# Altium footprint library JL_PCB.PCBLIB: 1129 footprints (part 16 of 72)
Each footprint in its own frame and in the unit in brackets; x right, y up, seen from the top. Pads: shape width x height; smd on the part's side, far side on the other; paste and mask are expansions set on the pad; w line width, h text height; cw(c..) or ccw(c..) is an arc to the next point about the centre after c.
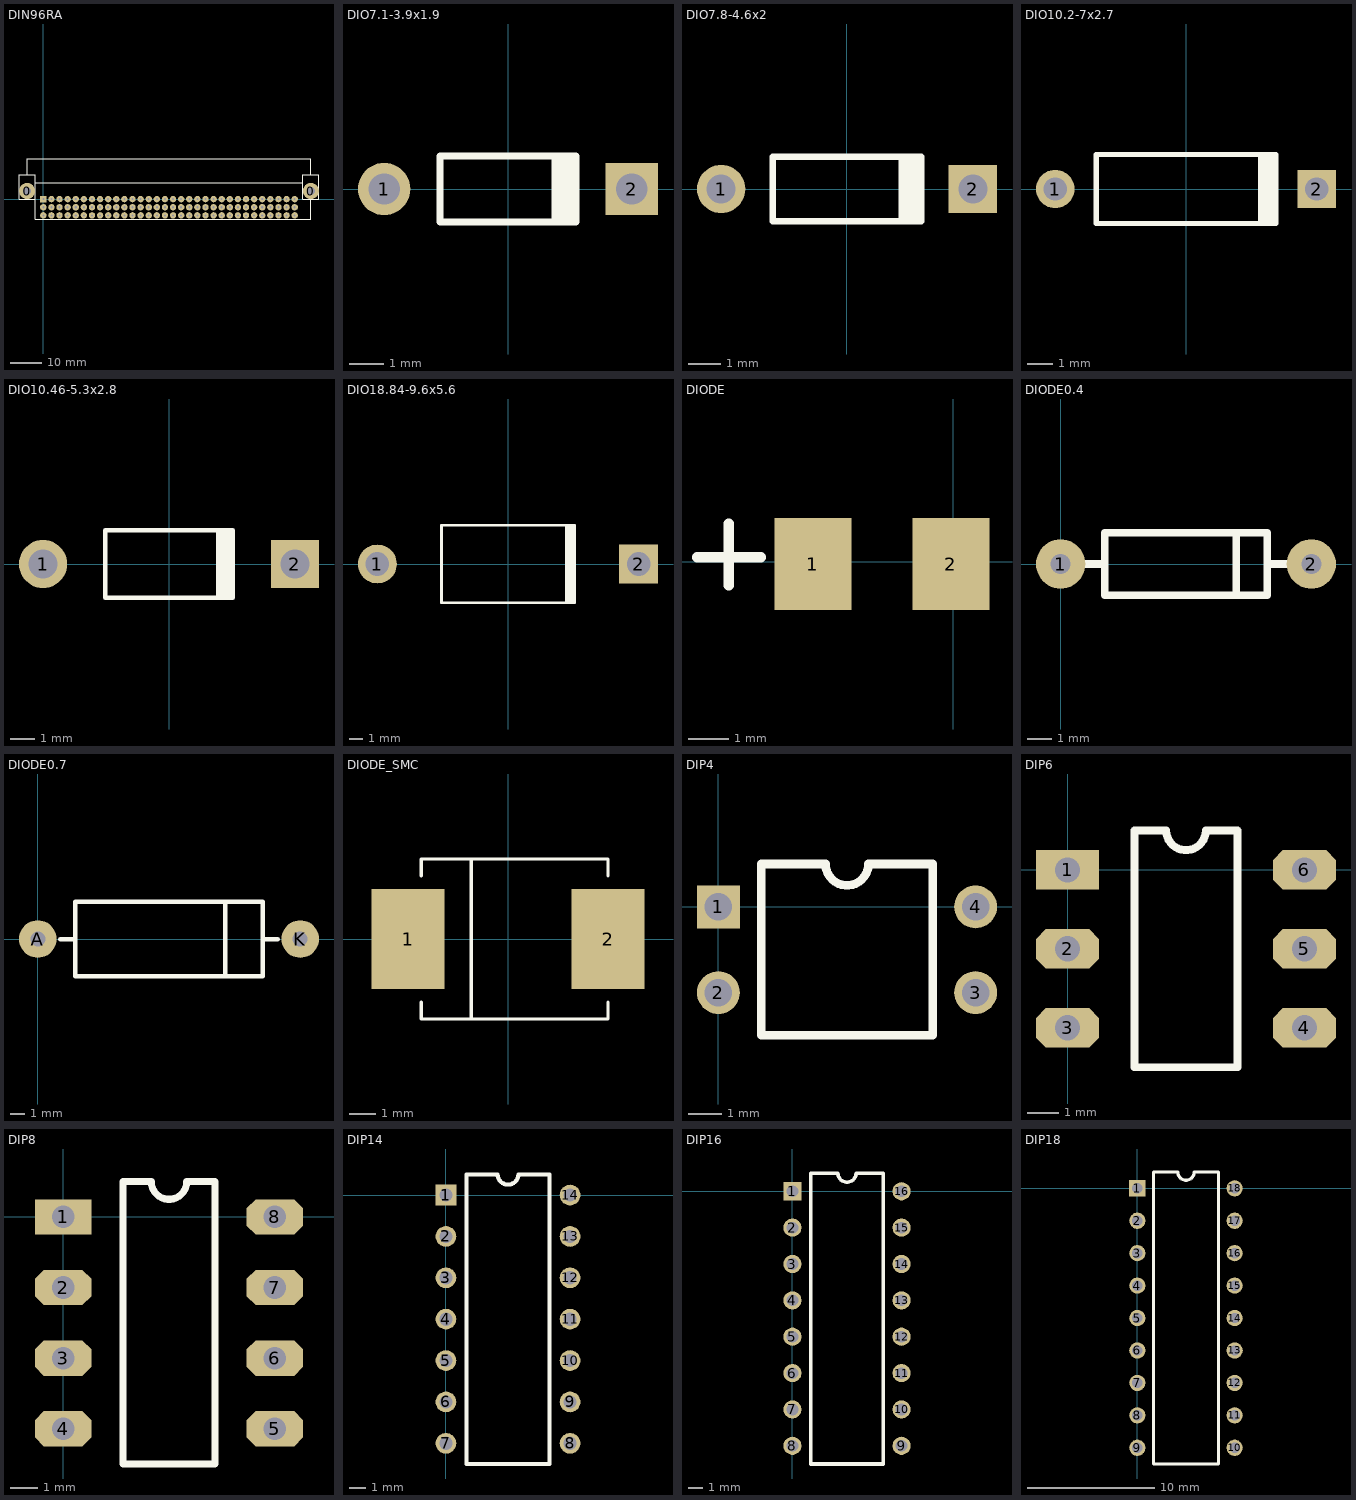
[diagram p15: the footprints below, top view; thin cyan lines are the x and y axes]

## DIN96RA [mm]
pads (98):
  round 5.08 hole 2.54: 0(-5.08,2.54) 0(83.82,2.54)
  rect 2x2 hole 0.635: 1A(0,0)
  round 2 hole 0.635: 1B(0,-2.54) 1C(0,-5.08) 2A(2.54,0) 2B(2.54,-2.54) 2C(2.54,-5.08) 3A(5.08,0) 3B(5.08,-2.54) 3C(5.08,-5.08) 4A(7.62,0) 4B(7.62,-2.54) 4C(7.62,-5.08) 5A(10.16,0) 5B(10.16,-2.54) 5C(10.16,-5.08) 6A(12.7,0) 6B(12.7,-2.54) 6C(12.7,-5.08) 7A(15.24,0) 7B(15.24,-2.54) 7C(15.24,-5.08) 8A(17.78,0) 8B(17.78,-2.54) 8C(17.78,-5.08) 9A(20.32,0) 9B(20.32,-2.54) 9C(20.32,-5.08) 10A(22.86,0) 10B(22.86,-2.54) 10C(22.86,-5.08) 11A(25.4,0) 11B(25.4,-2.54) 11C(25.4,-5.08) 12A(27.94,0) 12B(27.94,-2.54) 12C(27.94,-5.08) 13A(30.48,0) 13B(30.48,-2.54) 13C(30.48,-5.08) 14A(33.02,0) 14B(33.02,-2.54) 14C(33.02,-5.08) 15A(35.56,0) 15B(35.56,-2.54) 15C(35.56,-5.08) 16A(38.1,0) 16B(38.1,-2.54) 16C(38.1,-5.08) 17A(40.64,0) 17B(40.64,-2.54) 17C(40.64,-5.08) 18A(43.18,0) 18B(43.18,-2.54) 18C(43.18,-5.08) 19A(45.72,0) 19B(45.72,-2.54) 19C(45.72,-5.08) 20A(48.26,0) 20B(48.26,-2.54) 20C(48.26,-5.08) 21A(50.8,0) 21B(50.8,-2.54) 21C(50.8,-5.08) 22A(53.34,0) 22B(53.34,-2.54) 22C(53.34,-5.08) 23A(55.88,0) 23B(55.88,-2.54) 23C(55.88,-5.08) 24A(58.42,0) 24B(58.42,-2.54) 24C(58.42,-5.08) 25A(60.96,0) 25B(60.96,-2.54) 25C(60.96,-5.08) 26A(63.5,0) 26B(63.5,-2.54) 26C(63.5,-5.08) 27A(66.04,0) 27B(66.04,-2.54) 27C(66.04,-5.08) 28A(68.58,0) 28B(68.58,-2.54) 28C(68.58,-5.08) 29A(71.12,0) 29B(71.12,-2.54) 29C(71.12,-5.08) 30A(73.66,0) 30B(73.66,-2.54) 30C(73.66,-5.08) 31A(76.2,0) 31B(76.2,-2.54) 31C(76.2,-5.08) 32A(78.74,0) 32B(78.74,-2.54) 32C(78.74,-5.08)
TopOverlay:
  lines w0.254: -2.54,5.08 81.28,5.08 ; 83.82,0 83.82,-6.35 -2.54,-6.35 -2.54,0 ; -5.08,7.62 -2.54,7.62 -2.54,0 ; -5.08,7.62 -7.62,7.62 -7.62,0 -2.54,0 ; -5.08,7.62 -5.08,12.7 83.82,12.7 83.82,7.62 ; 83.82,7.62 86.36,7.62 86.36,0 81.28,0 81.28,7.62 83.82,7.62

## DIO7.1-3.9x1.9 [mm] "Diode, Axial; Body 3.8 x 1.9 mm (LxDia. max), Lead Dia. 0.53 mm (max)"
height 1.9
pads (2):
  round 1.5 hole 0.9: 1(-3.55,0)
  rect 1.5x1.5 hole 0.9: 2(3.55,0)
TopOverlay:
  rectangle: 1.25,-0.95 2.05,0.95
  lines w0.2: 1.95,-0.95 -1.95,-0.95 -1.95,0.95 1.95,0.95

## DIO7.8-4.6x2 [mm] "Diode, Axial; Body 4.6 x 1.9 mm (LxDia. max), Lead Dia. 0.53 mm (max)"
height 2
pads (2):
  round 1.5 hole 0.9: 1(-3.9,0)
  rect 1.5x1.5 hole 0.9: 2(3.9,0)
TopOverlay:
  rectangle: 1.6,-1 2.4,1
  lines w0.2: 2.3,-1 -2.3,-1 -2.3,1 2.3,1

## DIO10.2-7x2.7 [mm] "Diode, Axial; Body 7 x 2.7 mm (LxDia. max), Lead Dia. 0.53 mm (max)"
height 2.7
pads (2):
  round 1.5 hole 0.9: 1(-5.1,0)
  rect 1.5x1.5 hole 0.9: 2(5.1,0)
TopOverlay:
  rectangle: 2.8,-1.35 3.6,1.35
  lines w0.2: 3.5,-1.35 -3.5,-1.35 -3.5,1.35 3.5,1.35

## DIO10.46-5.3x2.8 [mm] "Diode, Axial; Body 5.2 x 2.7 mm (LxDia. max), Lead Dia. 0.86 mm (max)"
height 2.8
pads (2):
  round 2 hole 1.2: 1(-5.23,0)
  rect 2x2 hole 1.2: 2(5.23,0)
TopOverlay:
  rectangle: 1.95,-1.4 2.75,1.4
  lines w0.2: 2.65,-1.4 -2.65,-1.4 -2.65,1.4 2.65,1.4

## DIO18.84-9.6x5.6 [mm] "Diode, Axial; Body 9.5 x 5.6 mm (LxDia. max), Lead Dia. 1.32 mm (max)"
height 5.6
pads (2):
  round 2.8 hole 1.7: 1(-9.42,0)
  rect 2.8x2.8 hole 1.7: 2(9.42,0)
TopOverlay:
  rectangle: 4.1,-2.8 4.9,2.8
  lines w0.2: 4.8,-2.8 -4.8,-2.8 -4.8,2.8 4.8,2.8

## DIODE [mm]
pads (2):
  rect 1.905x2.286 smd: 1(-3.48,-0.05) 2(-0.051,-0.05)
TopOverlay:
  lines w0.254: -6.36,0.12 -4.77,0.12 ; -5.57,-0.58 -5.57,0.95

## DIODE0.4 [mm]
pads (2):
  round 2 hole 0.813: 1(0,0) 2(10.16,0)
TopOverlay:
  lines w0.305: 1.016,0 1.778,0 ; 7.112,-1.27 7.112,1.27 ; 8.382,0 9.144,0 ; 1.778,-1.27 1.778,1.27 8.382,1.27 8.382,-1.27 1.778,-1.27
3D body "DO-41.STEP": height 3.3, standoff -2, extent -0.367,-1.249 10.693,1.351

## DIODE0.7 [mil]
pads (2):
  round 100 hole 40: A(0,0) K(700,0)
TopOverlay:
  lines w12: 60,0 100,0 ; 500,-100 500,100 ; 600,0 640,0 ; 100,-100 100,100 600,100 600,-100 100,-100

## DIODE_SMC [mil] "Magnetic-Core Inductor with Winding Polarity Marking; 2 Leads"
pads (2):
  rect 110x150 smd: 1(-150,0) 2(150,0)
TopOverlay:
  lines w5: -130,-95 -130,-120 150,-120 150,-95 ; -130,95 -130,120 150,120 150,95 ; -55,-120 -55,120
Mechanical1:
  lines w1: -130,-120 150,-120 ; -130,120 150,120
3D body "DO214 SMB.STEP": height 39.57, standoff -51.18, extent -101.3,-74.73 111.3,67

## DIP4 [mil]
pads (4):
  rect 50x50 hole 32: 1(0,0)
  round 50 hole 32: 2(0,-100) 3(300,-100) 4(300,0)
TopOverlay:
  lines w10: 50,-150 50,50 125,50 ccw(c150,50) 175,50 250,50 250,-150 50,-150
3D body "CircuitWorks-DIP4.step": height 125.81, standoff -173.19, extent -8.48,-159.35 306.48,59

## DIP6 [mil]
pads (6):
  rect 80x50 hole 32: 1(0,0)
  oct 80x50 hole 32: 2(0,-100) 3(0,-200) 4(300,-200) 5(300,-100) 6(300,0)
TopOverlay:
  lines w10: 85,-250 85,50 125,50 ccw(c150,50) 175,50 215,50 215,-250 85,-250
3D body "DIP.STEP": height 210, standoff -95, extent -5,-250 305,50

## DIP8 [mil]
pads (8):
  rect 80x50 hole 32: 1(0,0)
  oct 80x50 hole 32: 2(0,-100) 3(0,-200) 4(0,-300) 5(300,-300) 6(300,-200) 7(300,-100) 8(300,0)
TopOverlay:
  lines w10: 85,-350 215,-350 215,50 175,50 cw(c150,50) 125,50 85,50 85,-350
3D body "DIP.STEP": height 210, standoff -95, extent -5,-350 305,50

## DIP14 [mil]
pads (14):
  rect 50x50 hole 32: 1(0,0)
  round 50 hole 32: 2(0,-100) 3(0,-200) 4(0,-300) 5(0,-400) 6(0,-500) 7(0,-600) 8(300,-600) 9(300,-500) 10(300,-400) 11(300,-300) 12(300,-200) 13(300,-100) 14(300,0)
TopOverlay:
  lines w10: 50,-650 250,-650 250,50 175,50 cw(c150,50) 125,50 50,50 50,-650
3D body "DIP14.STEP": height 179.92, standoff -150, extent -8,-683.48 299.87,81.48

## DIP16 [mil]
pads (16):
  rect 50x50 hole 32: 1(0,0)
  round 50 hole 32: 2(0,-100) 3(0,-200) 4(0,-300) 5(0,-400) 6(0,-500) 7(0,-600) 8(0,-700) 9(300,-700) 10(300,-600) 11(300,-500) 12(300,-400) 13(300,-300) 14(300,-200) 15(300,-100) 16(300,0)
TopOverlay:
  lines w10: 50,-750 250,-750 250,50 175,50 cw(c150,50) 125,50 50,50 50,-750
3D body "DIP16.STEP": height 179.92, standoff -150, extent -3,-732 304.87,32.96

## DIP18 [mil]
pads (18):
  rect 50x50 hole 32: 1(0,0)
  round 50 hole 32: 2(0,-100) 3(0,-200) 4(0,-300) 5(0,-400) 6(0,-500) 7(0,-600) 8(0,-700) 9(0,-800) 10(300,-800) 11(300,-700) 12(300,-600) 13(300,-500) 14(300,-400) 15(300,-300) 16(300,-200) 17(300,-100) 18(300,0)
TopOverlay:
  lines w10: 50,-850 50,50 125,50 ccw(c150,50) 175,50 250,50 250,-850 50,-850
3D body "DIP18.STEP": height 179.92, standoff -150, extent -7,-858 300.87,56.96